# Altium footprint library North POLE.PcbLib: 419 footprints (part 16 of 27)
Each footprint in its own frame and in the unit in brackets; x right, y up, seen from the top. Pads: shape width x height; smd on the part's side, far side on the other; paste and mask are expansions set on the pad; w line width, h text height; cw(c..) or ccw(c..) is an arc to the next point about the centre after c.
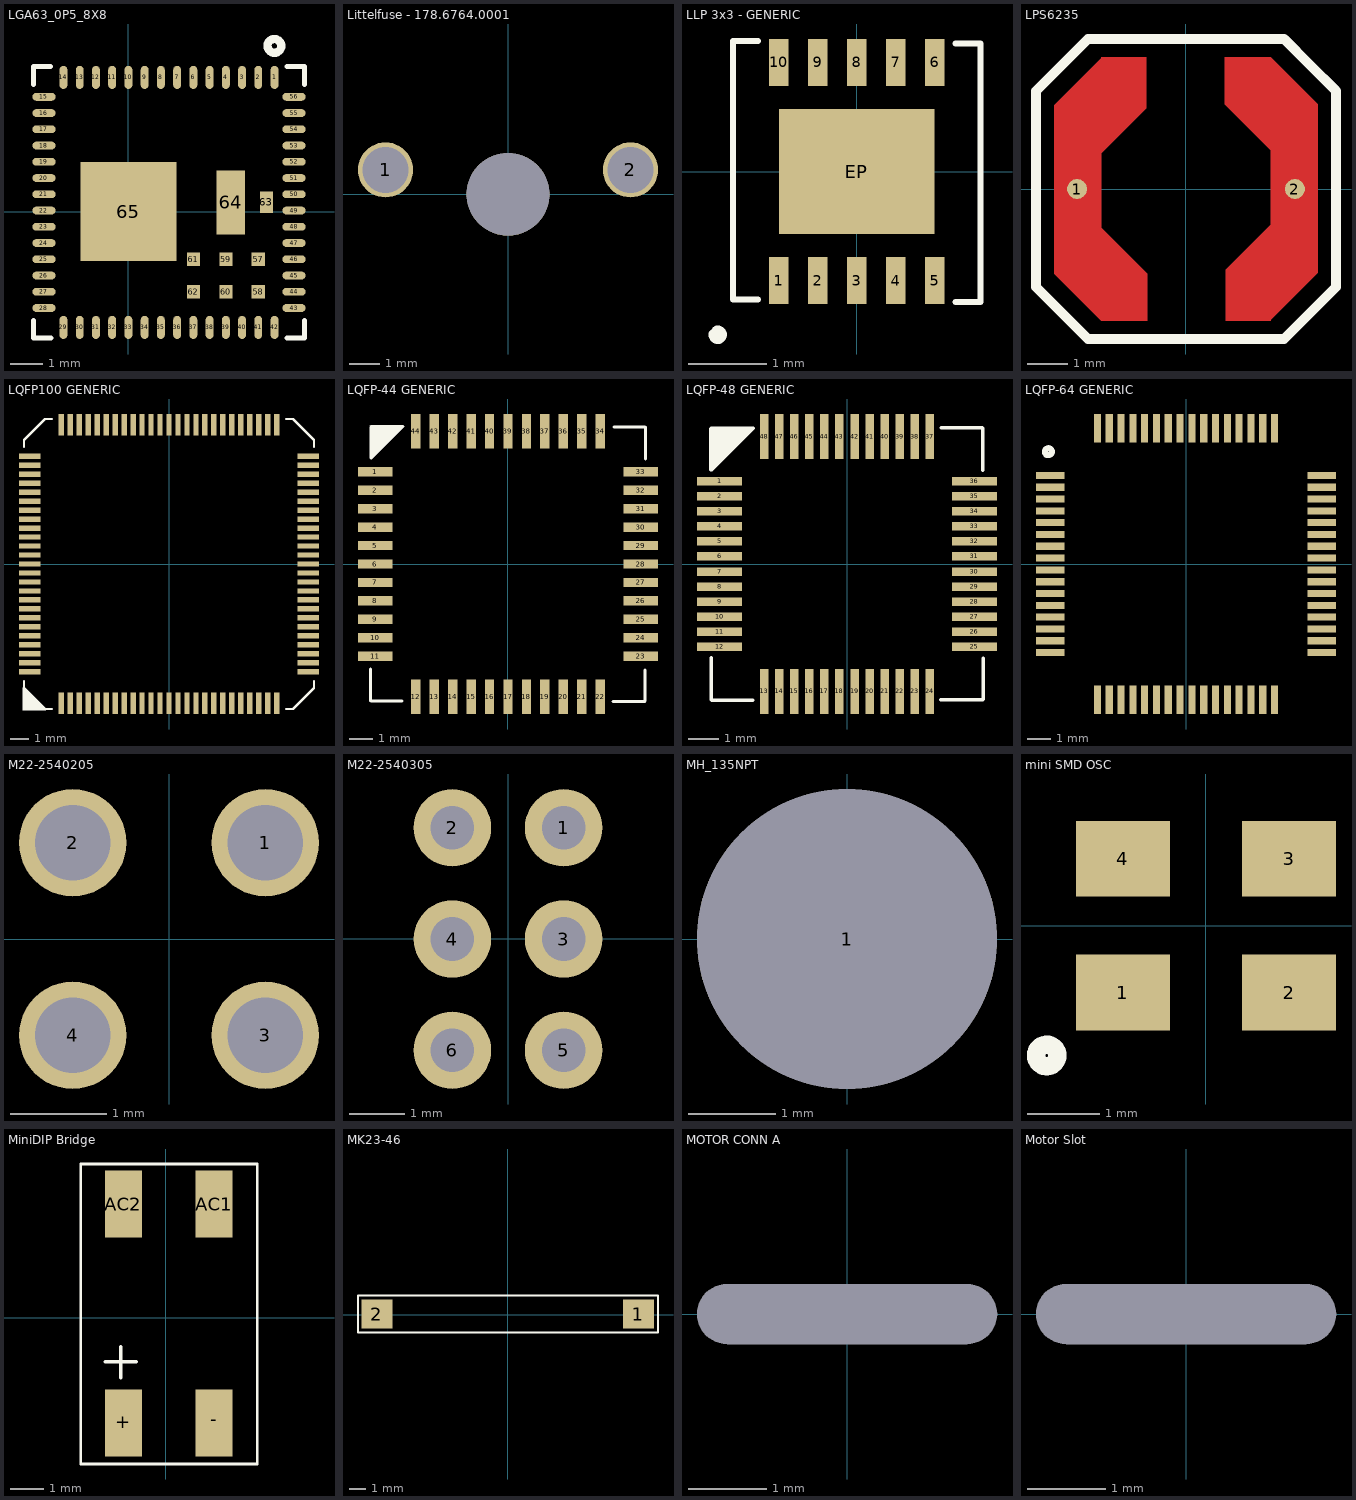
[diagram p15: the footprints below, top view; thin cyan lines are the x and y axes]

## LGA63_0P5_8X8 [mil]
pads (65):
  oval 9.45x28 smd: 1(177.16,162.52) 2(157.48,162.52) 3(137.79,162.52) 4(118.11,162.52) 5(98.42,162.52) 6(78.74,162.52) 7(59.05,162.52) 8(39.37,162.52) 9(19.68,162.52) 10(0,162.52) 11(-19.69,162.52) 12(-39.37,162.52) 13(-59.06,162.52) 14(-78.74,162.52) 29(-78.74,-140.48) 30(-59.06,-140.48) 31(-39.37,-140.48) 32(-19.69,-140.48) 33(0,-140.48) 34(19.68,-140.48) 35(39.37,-140.48) 36(59.05,-140.48) 37(78.74,-140.48) 38(98.42,-140.48) 39(118.11,-140.48) 40(137.79,-140.48) 41(157.48,-140.48) 42(177.16,-140.48)
  oval 28x9.45 smd paste+0: 15(-102.29,138.97)
  oval 28x9.45 smd: 16(-102.29,119.29) 17(-102.29,99.6) 18(-102.29,79.92) 19(-102.29,60.23) 20(-102.29,40.55) 21(-102.29,20.86) 22(-102.29,1.18) 23(-102.29,-18.51) 24(-102.29,-38.19) 25(-102.29,-57.88) 26(-102.29,-77.56) 27(-102.29,-97.25) 28(-102.29,-116.93) 43(200.71,-116.93) 44(200.71,-97.25) 45(200.71,-77.56) 46(200.71,-57.88) 47(200.71,-38.19) 48(200.71,-18.51) 49(200.71,1.18) 50(200.71,20.86) 51(200.71,40.55) 52(200.71,60.23) 53(200.71,79.92) 54(200.71,99.6) 55(200.71,119.29) 56(200.71,138.97)
  rect 16x16 smd paste-2.36: 57(157.48,-57.88) 59(118.11,-57.88) 60(118.11,-97.25) 61(78.74,-57.88) 62(78.74,-97.25)
  rect 16x16 smd paste-2.36 mask+4: 58(157.48,-97.25)
  rect 16x26 smd: 63(167.32,11.02)
  rect 35x78 smd paste-78.74 mask-39.37: 64(124,11.02)
  rect 116x120 smd paste-118.11 mask-118.11: 65(0,0)
Top Overlay:
  lines w6: -115.27,-131.93 -115.27,-153.46 -93.7,-153.46 ; -115.27,154.17 -115.27,175.5 -94.1,175.5 ; 192.12,175.5 213.69,175.5 213.69,153.97 ; 192.4,-153.46 213.69,-153.46 213.69,-131.89
  lines w10: 179.26,208.75 ccw(c176.91,200.74) 181.07,207.98
Top Paste:
  rectangle: 106.8,-7 119.2,29.7
  rectangle: 127,-28 140.4,1.4
  rectangle: 127.5,20.5 140.9,49.9
  rectangle: -53.9,-53.19 -21.9,-21.59
  rectangle: -16.5,-53.19 15.5,-21.59
  rectangle: 20.9,-53.19 52.9,-21.59
  rectangle: 20.9,-16.27 52.9,15.33
  rectangle: 20.9,20.6 52.9,52.2
  rectangle: -16.5,20.6 15.5,52.2
  rectangle: -53.9,20.6 -21.9,52.2
  rectangle: -53.9,-16.27 -21.9,15.33
  rectangle: -16,-15.8 16,15.8
  pour cut-out: 51.57,53.54 23.23,53.54 23.23,24.01 51.57,24.01
  pour cut-out: 51.57,16.14 23.23,16.14 23.23,-13.39 51.57,-13.39
  pour cut-out: 51.57,-21.26 23.23,-21.26 23.23,-50.79 51.57,-50.79
  pour cut-out: 15.35,-21.26 -12.99,-21.26 -12.99,-50.79 15.35,-50.79
  pour cut-out: 15.35,16.14 -12.99,16.14 -12.99,-13.39 15.35,-13.39
  pour cut-out: 15.35,53.54 -12.99,53.54 -12.99,24.01 15.35,24.01
  pour cut-out: -20.87,53.54 -49.22,53.54 -49.22,24.01 -20.87,24.01
  pour cut-out: -20.87,16.14 -49.22,16.14 -49.22,-13.39 -20.87,-13.39
  pour cut-out: -20.87,-21.26 -49.22,-21.26 -49.22,-50.79 -20.87,-50.79
Top Solder:
  rectangle: 127,-28 141.4,2.6
  rectangle: 127,20 141.4,50.4
  rectangle: 106.3,-7.8 120.7,30.2
  region: 53.97,-20.57 20.9,-20.57 20.9,-53.19 53.97,-53.19
  region: 16.57,-20.57 -16.5,-20.57 -16.5,-53.19 16.57,-53.19
  region: -20.83,-20.57 -53.9,-20.57 -53.9,-53.19 -20.83,-53.19
  rectangle: 20.9,20.6 53.97,53.22
  rectangle: 20.9,-16.27 53.97,16.3
  rectangle: -53.9,-16.27 -20.83,16.3
  rectangle: -53.9,20.6 -20.83,53.22
  rectangle: -16.5,-16.27 16.57,16.3
  rectangle: -16.5,20.6 16.57,53.22

## Littelfuse - 178.6764.0001 [mm]
pads (3):
  round 1.8 hole 1.5: 1(-4,0.8) 2(4,0.8)
  round 2.7 hole 2.7 unplated: ""(0,0)
3D body: height 15.6, standoff 0, extent -7,-3.023 7.036,3.045

## LLP 3x3 - GENERIC [mm] "0.156-inch-separation 1x2 header with shroud"
pads (11):
  rect 0.25x0.6 smd mask+0.05: 1(-1,-1.4) 2(-0.5,-1.4) 3(0,-1.4) 4(0.5,-1.4) 5(1,-1.4) 6(1,1.4) 7(0.5,1.4) 8(0,1.4) 9(-0.5,1.4) 10(-1,1.4)
  rect 2x1.6 smd mask+0.08: EP(0,0)
Top Overlay:
  lines w0.076: -1.268,-1.644 -1.587,-1.644 -1.587,1.675 -1.268,1.675 ; 1.268,-1.675 1.587,-1.675 1.587,1.644 1.268,1.644
  lines w0.127: -1.836,-2.085 ccw(c-1.783,-2.095) -1.803,-2.045
3D body: height 0.8, standoff 0, extent -1.509,-1.515 1.503,1.508

## LPS6235 [mm]
pads (2):
  round 0.5 smd: 1(-2.725,0) 2(2.725,0)
Top Layer:
  region: 1,-3.3 2.125,-3.3 2.125,-3.275 3.3,-2.1 3.3,2.125 2.125,3.3 0.975,3.3 0.975,2.125 2.125,0.975 2.125,-0.9 1,-2.025
  region: -1,3.3 -2.125,3.3 -2.125,3.275 -3.3,2.1 -3.3,-2.125 -2.125,-3.3 -0.975,-3.3 -0.975,-2.125 -2.125,-0.975 -2.125,0.9 -1,2.025
Top Overlay:
  lines w0.254: -3.752,-2.453 -3.752,2.454 -2.454,3.752 2.454,3.752 3.103,3.103 3.752,2.454 3.752,-2.454 2.454,-3.752 -2.453,-3.752 -3.752,-2.453
Top Paste:
  region: -1,3.3 -2.125,3.3 -2.125,3.275 -3.3,2.1 -3.3,-2.125 -2.125,-3.3 -0.975,-3.3 -0.975,-2.125 -2.125,-0.975 -2.125,0.9 -1,2.025
  region: 1,-3.3 2.125,-3.3 2.125,-3.275 3.3,-2.1 3.3,2.125 2.125,3.3 0.975,3.3 0.975,2.125 2.125,0.975 2.125,-0.9 1,-2.025
3D body: height 3.5, standoff 0, extent -3.103,-3.103 3.103,3.103

## LQFP100 GENERIC [mm]
pads (100):
  rect 0.3x1.2 smd: 1(-6,-7.75) 2(-5.5,-7.75) 3(-5,-7.75) 4(-4.5,-7.75) 5(-4,-7.75) 6(-3.5,-7.75) 7(-3,-7.75) 8(-2.5,-7.75) 9(-2,-7.75) 10(-1.5,-7.75) 11(-1,-7.75) 12(-0.5,-7.75) 13(0,-7.75) 14(0.5,-7.75) 15(1,-7.75) 16(1.5,-7.75) 17(2,-7.75) 18(2.5,-7.75) 19(3,-7.75) 20(3.5,-7.75) 21(4,-7.75) 22(4.5,-7.75) 23(5,-7.75) 24(5.5,-7.75) 25(6,-7.75) 51(6,7.75) 52(5.5,7.75) 53(5,7.75) 54(4.5,7.75) 55(4,7.75) 56(3.5,7.75) 57(3,7.75) 58(2.5,7.75) 59(2,7.75) 60(1.5,7.75) 61(1,7.75) 62(0.5,7.75) 63(0,7.75) 64(-0.5,7.75) 65(-1,7.75) 66(-1.5,7.75) 67(-2,7.75) 68(-2.5,7.75) 69(-3,7.75) 70(-3.5,7.75) 71(-4,7.75) 72(-4.5,7.75) 73(-5,7.75) 74(-5.5,7.75) 75(-6,7.75)
  rect 1.2x0.3 smd: 26(7.75,-6) 27(7.75,-5.5) 28(7.75,-5) 29(7.75,-4.5) 30(7.75,-4) 31(7.75,-3.5) 32(7.75,-3) 33(7.75,-2.5) 34(7.75,-2) 35(7.75,-1.5) 36(7.75,-1) 37(7.75,-0.5) 38(7.75,0) 39(7.75,0.5) 40(7.75,1) 41(7.75,1.5) 42(7.75,2) 43(7.75,2.5) 44(7.75,3) 45(7.75,3.5) 46(7.75,4) 47(7.75,4.5) 48(7.75,5) 49(7.75,5.5) 50(7.75,6) 76(-7.75,6) 77(-7.75,5.5) 78(-7.75,5) 79(-7.75,4.5) 80(-7.75,4) 81(-7.75,3.5) 82(-7.75,3) 83(-7.75,2.5) 84(-7.75,2) 85(-7.75,1.5) 86(-7.75,1) 87(-7.75,0.5) 88(-7.75,0) 89(-7.75,-0.5) 90(-7.75,-1) 91(-7.75,-1.5) 92(-7.75,-2) 93(-7.75,-2.5) 94(-7.75,-3) 95(-7.75,-3.5) 96(-7.75,-4) 97(-7.75,-4.5) 98(-7.75,-5) 99(-7.75,-5.5) 100(-7.75,-6)
Top Overlay:
  region: -8.141,-6.881 -6.909,-8.077 -6.863,-8.141 -8.138,-8.141
  lines w0.127: -8.077,-6.528 -8.077,-6.909 -6.909,-8.077 -6.528,-8.077 ; -8.077,6.528 -8.077,6.909 -6.909,8.077 -6.528,8.077 ; 6.528,-8.077 6.909,-8.077 8.077,-6.909 8.077,-6.528 ; 6.528,8.077 6.909,8.077 8.077,6.909 8.077,6.528
3D body: height 1.6, standoff 0, extent -8,-8 8,8

## LQFP-44 GENERIC [mm]
pads (44):
  rect 1.5x0.406 smd mask+0.075: 1(-5.75,4) 2(-5.75,3.2) 3(-5.75,2.4) 4(-5.75,1.6) 5(-5.75,0.8) 6(-5.75,0) 7(-5.75,-0.8) 8(-5.75,-1.6) 9(-5.75,-2.4) 10(-5.75,-3.2) 11(-5.75,-4) 23(5.75,-4) 24(5.75,-3.2) 25(5.75,-2.4) 26(5.75,-1.6) 27(5.75,-0.8) 28(5.75,0) 29(5.75,0.8) 30(5.75,1.6) 31(5.75,2.4) 32(5.75,3.2) 33(5.75,4)
  rect 0.406x1.5 smd mask+0.075: 12(-4,-5.75) 13(-3.2,-5.75) 14(-2.4,-5.75) 15(-1.6,-5.75) 16(-0.8,-5.75) 17(0,-5.75) 18(0.8,-5.75) 19(1.6,-5.75) 20(2.4,-5.75) 21(3.2,-5.75) 22(4,-5.75) 34(4,5.75) 35(3.2,5.75) 36(2.4,5.75) 37(1.6,5.75) 38(0.8,5.75) 39(0,5.75) 40(-0.8,5.75) 41(-1.6,5.75) 42(-2.4,5.75) 43(-3.2,5.75) 44(-4,5.75)
Top Overlay:
  region: -5.898,5.92 -5.921,5.897 -5.921,4.589 -4.566,5.944 -5.944,5.944
  lines w0.127: -5.962,-5.925 -5.962,-4.547 ; -5.944,-5.944 -4.589,-5.944 ; 4.547,-5.962 5.925,-5.962 ; 4.589,5.944 5.944,5.944 ; 5.944,-5.944 5.944,-4.589 ; 5.962,4.547 5.962,5.925 ; -5.944,4.589 -5.944,5.944 -5.925,5.962 -4.547,5.962 -4.547,5.963 -5.921,4.589 -5.944,4.589
3D body: height 1.5, standoff 0.02, extent -6,-6 6,6

## LQFP-48 GENERIC [mm]
pads (48):
  rect 1.5x0.28 smd mask+0.075: 1(-4.225,2.75) 2(-4.225,2.25) 3(-4.225,1.75) 4(-4.225,1.25) 5(-4.225,0.75) 6(-4.225,0.25) 7(-4.225,-0.25) 8(-4.225,-0.75) 9(-4.225,-1.25) 10(-4.225,-1.75) 11(-4.225,-2.25) 12(-4.225,-2.75) 25(4.225,-2.75) 26(4.225,-2.25) 27(4.225,-1.75) 28(4.225,-1.25) 29(4.225,-0.75) 30(4.225,-0.25) 31(4.225,0.25) 32(4.225,0.75) 33(4.225,1.25) 34(4.225,1.75) 35(4.225,2.25) 36(4.225,2.75)
  rect 0.28x1.5 smd mask+0.075: 13(-2.75,-4.225) 14(-2.25,-4.225) 15(-1.75,-4.225) 16(-1.25,-4.225) 17(-0.75,-4.225) 18(-0.25,-4.225) 19(0.25,-4.225) 20(0.75,-4.225) 21(1.25,-4.225) 22(1.75,-4.225) 23(2.25,-4.225) 24(2.75,-4.225) 37(2.75,4.225) 38(2.25,4.225) 39(1.75,4.225) 40(1.25,4.225) 41(0.75,4.225) 42(0.25,4.225) 43(-0.25,4.225) 44(-0.75,4.225) 45(-1.25,4.225) 46(-1.75,4.225) 47(-2.25,4.225) 48(-2.75,4.225)
Top Overlay:
  region: -4.473,4.458 -4.496,4.435 -4.496,3.127 -3.141,4.482 -4.519,4.482
  lines w0.127: -4.501,-3.122 -4.5,-3.122 -4.5,-4.5 -4.482,-4.519 -3.127,-4.519 ; 3.122,-4.501 3.122,-4.5 4.5,-4.5 4.519,-4.482 4.519,-3.127 ; 3.127,4.519 4.482,4.519 4.5,4.5 4.5,3.122 4.501,3.122 ; -4.519,3.127 -4.496,3.127 -3.122,4.501 -3.122,4.5 -4.5,4.5 -4.519,4.482 -4.519,3.127
3D body: height 1.56, standoff 0, extent -4.5,-4.5 4.5,4.5

## LQFP-64 GENERIC [mm]
pads (64):
  rect 1.2x0.3 smd mask+0.075: 1(-5.75,3.75) 2(-5.75,3.25) 3(-5.75,2.75) 4(-5.75,2.25) 5(-5.75,1.75) 6(-5.75,1.25) 7(-5.75,0.75) 8(-5.75,0.25) 9(-5.75,-0.25) 10(-5.75,-0.75) 11(-5.75,-1.25) 12(-5.75,-1.75) 13(-5.75,-2.25) 14(-5.75,-2.75) 15(-5.75,-3.25) 16(-5.75,-3.75) 33(5.75,-3.75) 34(5.75,-3.25) 35(5.75,-2.75) 36(5.75,-2.25) 37(5.75,-1.75) 38(5.75,-1.25) 39(5.75,-0.75) 40(5.75,-0.25) 41(5.75,0.25) 42(5.75,0.75) 43(5.75,1.25) 44(5.75,1.75) 45(5.75,2.25) 46(5.75,2.75) 47(5.75,3.25) 48(5.75,3.75)
  rect 0.3x1.2 smd mask+0.075: 17(-3.75,-5.75) 18(-3.25,-5.75) 19(-2.75,-5.75) 20(-2.25,-5.75) 21(-1.75,-5.75) 22(-1.25,-5.75) 23(-0.75,-5.75) 24(-0.25,-5.75) 25(0.25,-5.75) 26(0.75,-5.75) 27(1.25,-5.75) 28(1.75,-5.75) 29(2.25,-5.75) 30(2.75,-5.75) 31(3.25,-5.75) 32(3.75,-5.75) 49(3.75,5.75) 50(3.25,5.75) 51(2.75,5.75) 52(2.25,5.75) 53(1.75,5.75) 54(1.25,5.75) 55(0.75,5.75) 56(0.25,5.75) 57(-0.25,5.75) 58(-0.75,5.75) 59(-1.25,5.75) 60(-1.75,5.75) 61(-2.25,5.75) 62(-2.75,5.75) 63(-3.25,5.75) 64(-3.75,5.75)
Top Overlay:
  lines w0.254: -5.735,4.869 ccw(c-5.826,4.752) -5.713,4.848
3D body: height 1.5, standoff 0.02, extent -6,-6 6,6

## M22-2540205 [mil] "0.156-inch-separation 1x2 header with shroud"
pads (4):
  round 44 hole 31: 1(39.5,39.5) 2(-39.5,39.5) 3(39.5,-39.5) 4(-39.5,-39.5)

## M22-2540305 [mil] "0.156-inch-separation 1x2 header with shroud"
pads (6):
  round 55 hole 31: 1(39.5,78.87) 2(-39.5,78.87) 3(39.5,-0.13) 4(-39.5,-0.13) 5(39.5,-79.13) 6(-39.5,-79.13)

## MH_135NPT [mil] "NPTH 135 thou mounting hole"
pads (1):
  round 135 hole 135 unplated mask+1.57: 1(0,0)

## mini SMD OSC [mm]
pads (4):
  rect 1.3x1.05 smd: 1(-1.15,-0.925) 2(1.15,-0.925) 3(1.15,0.925) 4(-1.15,0.925)
Top Overlay:
  lines w0.254: -2.112,-1.679 ccw(c-2.202,-1.796) -2.09,-1.7
3D body: height 0.6, standoff 0, extent -1.62,-1.25 1.66,1.25

## MiniDIP Bridge [mm]
pads (4):
  rect 1.1x2 smd mask+0.08: +(-1.265,-3.122) -(1.427,-3.122) AC1(1.427,3.381) AC2(-1.265,3.381)
Top Overlay:
  lines w0.076: -2.536,-4.342 -2.536,4.57 2.715,4.57 2.715,-4.342 -2.536,-4.342
  lines w0.1: -1.799,-1.307 -0.875,-1.307 ; -1.339,-1.787 -1.339,-0.85
3D body: height 2.96, standoff 0.05, extent -2.394,-3.39 2.556,3.65

## MK23-46 [mm]
pads (2):
  rect 1.9x1.8 smd mask+0.08: 1(8.05,0.031) 2(-8.05,0.031)
Top Overlay:
  lines w0.127: -9.215,-1.1 -9.215,1.173 9.251,1.173 9.251,-1.1 -9.215,-1.1
3D body: height 2.02, standoff -0.01, extent -8.789,-1.01 8.788,1.014

## MOTOR CONN A [mil]
pads (1):
  round 0 hole 30 slot 150 at 0 deg mask+3.15: 1(0,0)
Top Solder:
  lines w60: -60,0 59,0

## Motor Slot [mil]
pads (1):
  round 0 hole 30 slot 150 at 0 deg mask+3.15: 1(0,0)
Top Solder:
  lines w60: -60,0 61,0